# Altium footprint library TH IC footprints.PcbLib: 94 footprints (part 5 of 6)
Each footprint in its own frame and in the unit in brackets; x right, y up, seen from the top. Pads: shape width x height; smd on the part's side, far side on the other; paste and mask are expansions set on the pad; w line width, h text height; cw(c..) or ccw(c..) is an arc to the next point about the centre after c.
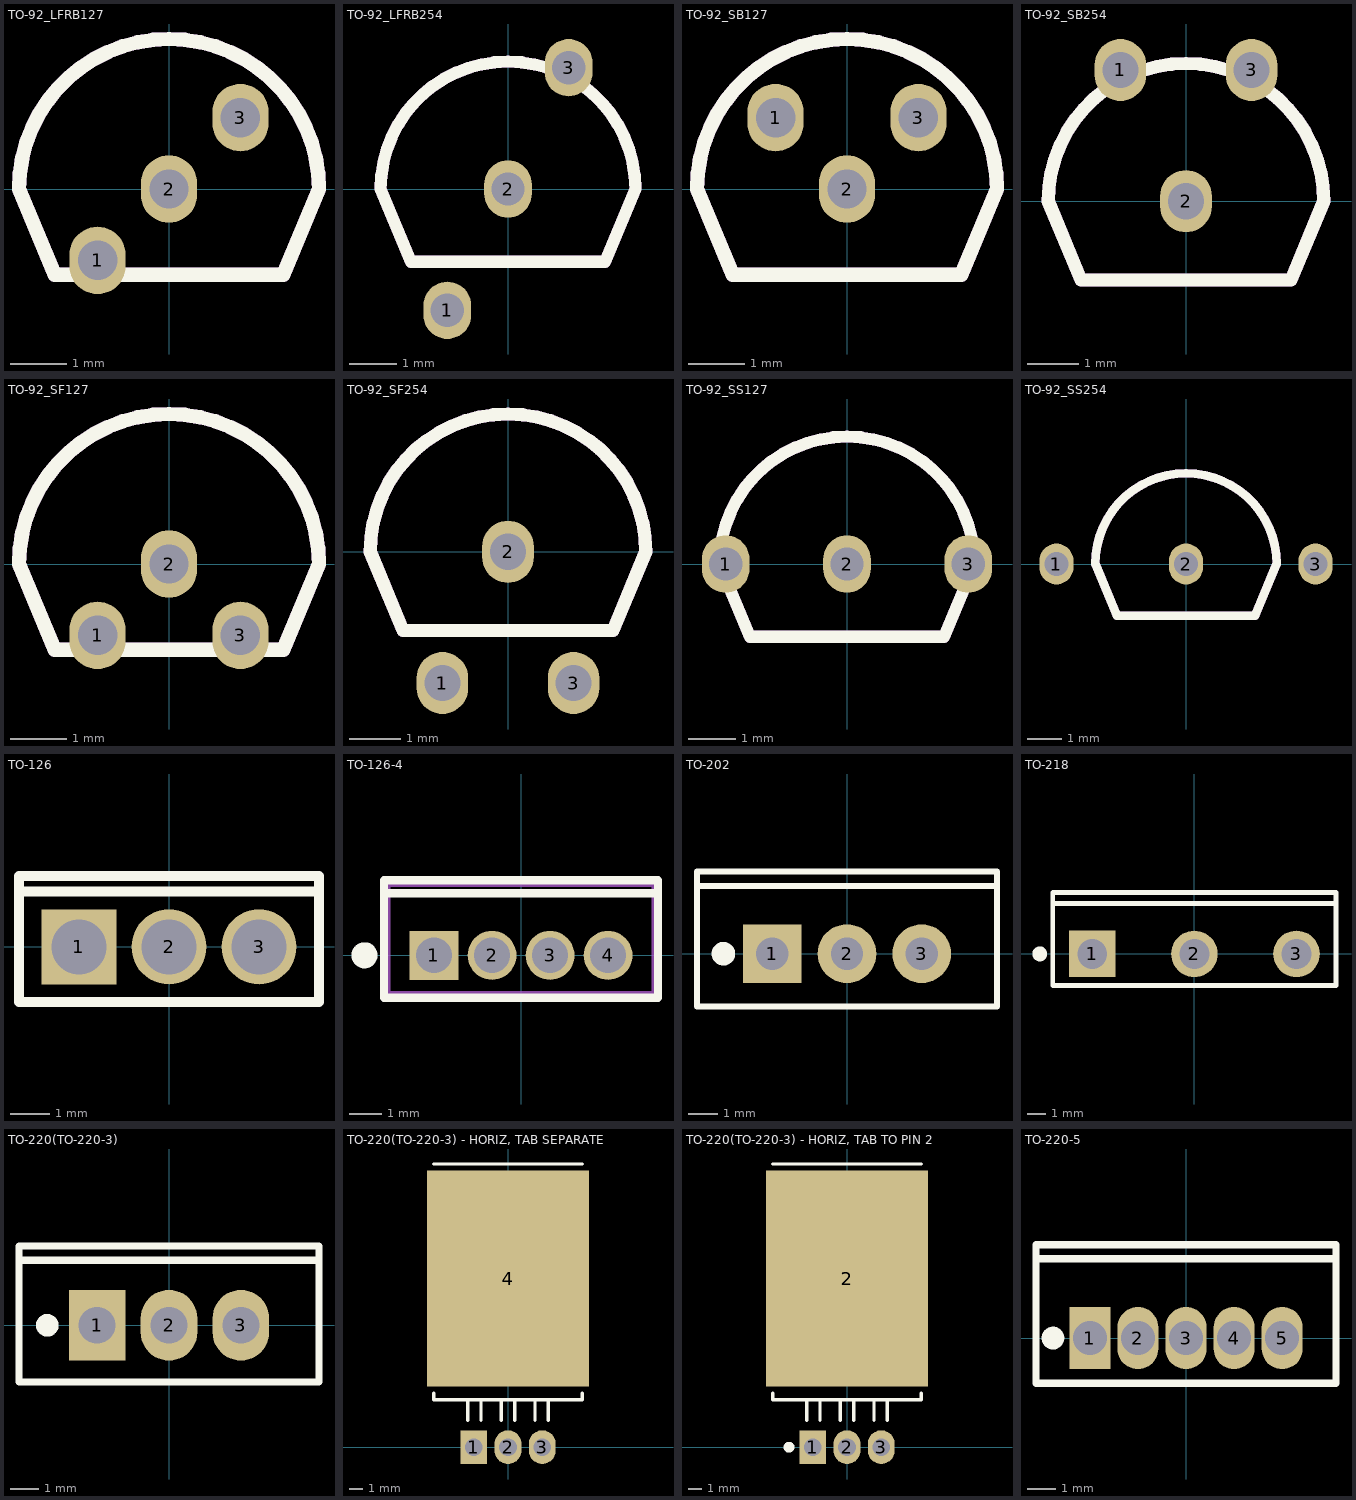
[diagram p4: the footprints below, top view; thin cyan lines are the x and y axes]

## TO-92_LFRB127 [mm]
pads (3):
  oval 1x1.2 hole 0.7 mask+0.051: 1(-1.27,-1.27) 2(0,0) 3(1.27,1.27)
Top Overlay:
  lines w0.254: -2.667,0 cw(c0,0) 2.667,0 2.032,-1.524 -2.032,-1.524 -2.667,0
Mechanical 13:
  lines w0.254: -2.667,0 cw(c0,0) 2.667,0 2.032,-1.524 -2.032,-1.524 -2.667,0
3D body "TO-92_LFRB127.SLDPRT": height 8.5, standoff -4, extent -2.5,-1.47 2.5,2.5

## TO-92_LFRB254 [mm]
pads (3):
  oval 1x1.2 hole 0.7 mask+0.051: 1(-1.27,-2.54) 2(0,0) 3(1.27,2.54)
Top Overlay:
  lines w0.254: -2.667,0 cw(c0,0) 2.667,0 2.032,-1.524 -2.032,-1.524 -2.667,0
Mechanical 13:
  lines w0.254: -2.667,0 cw(c0,0) 2.667,0 2.032,-1.524 -2.032,-1.524 -2.667,0
3D body "TO-92_LFRB254.SLDPRT": height 9.6, standoff -2.9, extent -2.5,-2.74 2.5,2.74

## TO-92_SB127 [mm]
pads (3):
  oval 1x1.2 hole 0.7 mask+0.051: 1(-1.27,1.27) 2(0,0) 3(1.27,1.27)
Top Overlay:
  lines w0.254: -2.667,0 cw(c0,0) 2.667,0 2.032,-1.524 -2.032,-1.524 -2.667,0
Mechanical 13:
  lines w0.254: -2.667,0 cw(c0,0) 2.667,0 2.032,-1.524 -2.032,-1.524 -2.667,0
3D body "TO-92_SB127.SLDPRT": height 8.5, standoff -4, extent -2.5,-1.37 2.5,2.5

## TO-92_SB254 [mm]
pads (3):
  oval 1x1.2 hole 0.7 mask+0.051: 1(-1.27,2.54) 2(0,0) 3(1.27,2.54)
Top Overlay:
  lines w0.254: -2.667,0 cw(c0,0) 2.667,0 2.032,-1.524 -2.032,-1.524 -2.667,0
Mechanical 13:
  lines w0.254: -2.667,0 cw(c0,0) 2.667,0 2.032,-1.524 -2.032,-1.524 -2.667,0
3D body "TO-92_SB254.SLDPRT": height 9.6, standoff -2.9, extent -2.5,-1.37 2.5,2.74

## TO-92_SF127 [mm]
pads (3):
  oval 1x1.2 hole 0.7 mask+0.051: 1(-1.27,-1.27) 2(0,0) 3(1.27,-1.27)
Top Overlay:
  lines w0.254: -2.667,0 cw(c0,0) 2.667,0 2.032,-1.524 -2.032,-1.524 -2.667,0
Mechanical 13:
  lines w0.254: -2.667,0 cw(c0,0) 2.667,0 2.032,-1.524 -2.032,-1.524 -2.667,0
3D body "TO-92_SF127.SLDPRT": height 8.5, standoff -4, extent -2.5,-1.47 2.5,2.5

## TO-92_SF254 [mm]
pads (3):
  oval 1x1.2 hole 0.7 mask+0.051: 1(-1.27,-2.54) 2(0,0) 3(1.27,-2.54)
Top Overlay:
  lines w0.254: -2.667,0 cw(c0,0) 2.667,0 2.032,-1.524 -2.032,-1.524 -2.667,0
Mechanical 13:
  lines w0.254: -2.667,0 cw(c0,0) 2.667,0 2.032,-1.524 -2.032,-1.524 -2.667,0
3D body "TO-92_SF254.SLDPRT": height 9.6, standoff -2.9, extent -2.5,-2.74 2.5,2.5

## TO-92_SS127 [mm]
pads (3):
  oval 1x1.2 hole 0.7 mask+0.051: 1(-2.54,0) 2(0,0) 3(2.54,0)
Top Overlay:
  lines w0.254: -2.667,0 cw(c0,0) 2.667,0 2.032,-1.524 -2.032,-1.524 -2.667,0
Mechanical 13:
  lines w0.254: -2.667,0 cw(c0,0) 2.667,0 2.032,-1.524 -2.032,-1.524 -2.667,0
3D body "TO-92_SS127.SLDPRT": height 8.5, standoff -4, extent -2.77,-1.37 2.77,2.5

## TO-92_SS254 [mm]
pads (3):
  oval 1x1.2 hole 0.7 mask+0.051: 1(-3.81,0) 2(0,0) 3(3.81,0)
Top Overlay:
  lines w0.254: -2.667,0 cw(c0,0) 2.667,0 2.032,-1.524 -2.032,-1.524 -2.667,0
Mechanical 13:
  lines w0.254: -2.667,0 cw(c0,0) 2.667,0 2.032,-1.524 -2.032,-1.524 -2.667,0
3D body "TO-92_SS254.SLDPRT": height 9.6, standoff -2.9, extent -4.04,-1.37 4.04,2.5

## TO-126 [mm]
pads (3):
  rect 1.9x1.9 hole 1.4: 1(-2.28,0)
  round 1.9 hole 1.4: 2(0,0) 3(2.28,0)
Top Overlay:
  lines w0.254: -3.8,1.4 3.8,1.4 ; -3.8,-1.4 3.8,-1.4 3.8,1.8 -3.8,1.8 -3.8,-1.4
3D body "User Library-TO-126 (SOT32) PCB.STEP": height 13.19, standoff -3.54, extent -3.8,-1 3.8,1.55

## TO-126-4 [mm]
pads (4):
  rect 1.5x1.5 hole 1.1 mask+0.051: 1(-2.67,0)
  round 1.5 hole 1.1 mask+0.051: 2(-0.89,0) 3(0.89,0) 4(2.67,0)
Top Overlay:
  circle w0.4: c-4.8,0 r0.2
  lines w0.254: -4.2,1.9 4.2,1.9 ; -4.2,-1.3 -4.2,2.3 4.2,2.3 4.2,-1.3 -4.2,-1.3
Mechanical 13:
  lines w0.2: -4.1,-1.2 -4.1,2.2 4.1,2.2 4.1,-1.2 -4.1,-1.2

## TO-202 [mm]
pads (3):
  rect 2x2 hole 1.1: 1(-2.54,0)
  round 2 hole 1.1: 2(0,0) 3(2.54,0)
Top Overlay:
  circle w0.4: c-4.2,0 r0.2
  lines w0.203: -5.1,2.3 5.1,2.3 ; -5.1,-1.8 5.1,-1.8 5.1,2.8 -5.1,2.8 -5.1,-1.8

## TO-218 [mm]
pads (3):
  rect 2.5x2.5 hole 1.6: 1(-5.48,0)
  round 2.5 hole 1.6: 2(0,0) 3(5.48,0)
Top Overlay:
  circle w0.4: c-8.3,0 r0.2
  lines w0.254: -7.6,2.7 7.6,2.7 ; -7.6,-1.7 7.6,-1.7 7.6,3.3 -7.6,3.3 -7.6,-1.7

## TO-220(TO-220-3) [mm]
pads (3):
  rect 2x2.5 hole 1.3: 1(-2.54,0)
  oval 2x2.5 hole 1.3: 2(0,0) 3(2.54,0)
Top Overlay:
  circle w0.4: c-4.3,0 r0.2
  lines w0.254: -5.3,2.3 5.3,2.3 ; -5.3,-2 5.3,-2 5.3,2.8 -5.3,2.8 -5.3,-2
3D body "TO220-A PCB.SLDPRT": height 18.99, standoff -4.5, extent -4.95,-1.55 4.95,2.907

## TO-220(TO-220-3) - HORIZ, TAB SEPARATE [mm]
pads (4):
  rect 2x2.5 hole 1.3: 1(-2.54,0)
  oval 2x2.5 hole 1.3: 2(0,0) 3(2.54,0)
  rect 12x16 smd: 4(0,12.5)
Top Overlay:
  lines w0.254: -5.5,4 -5.5,3.5 5.5,3.5 5.5,4 ; -5.5,21 5.5,21 ; -3,2 -3,3.5 ; -2,2 -2,3.5 ; -0.5,2 -0.5,3.5 ; 0.5,2 0.5,3.5 ; 2,2 2,3.5 ; 3,2 3,3.5
3D body "TO220-A-H PCB.SLDPRT": height 4.55, standoff -3.58, extent -4.95,-0.263 4.95,19.95

## TO-220(TO-220-3) - HORIZ, TAB TO PIN 2 [mm]
pads (4):
  rect 2x2.5 hole 1.3: 1(-2.54,0)
  oval 2x2.5 hole 1.3: 2(0,0) 3(2.54,0)
  rect 12x16 smd: 2(0,12.5)
Top Overlay:
  circle w0.4: c-4.3,0 r0.2
  lines w0.254: -5.5,4 -5.5,3.5 5.5,3.5 5.5,4 ; -5.5,21 5.5,21 ; -3,2 -3,3.5 ; -2,2 -2,3.5 ; -0.5,2 -0.5,3.5 ; 0.5,2 0.5,3.5 ; 2,2 2,3.5 ; 3,2 3,3.5
3D body "TO220-A-H PCB.SLDPRT": height 4.55, standoff -3.58, extent -4.95,-0.263 4.95,19.95

## TO-220-5 [mm]
pads (5):
  rect 1.45x2.2 hole 1.2 mask+0.051: 1(-3.4,0)
  oval 1.45x2.2 hole 1.2 mask+0.051: 2(-1.7,0) 3(0,0) 4(1.7,0) 5(3.4,0)
Top Overlay:
  circle w0.4: c-4.7,0 r0.2
  lines w0.254: -5.2,2.8 5.3,2.8 ; -5.3,-1.6 -5.3,3.3 5.3,3.3 5.3,-1.6 -5.3,-1.6